# Altium footprint library PCBlib.PcbLib: 9 footprints
Each footprint in its own frame and in the unit in brackets; x right, y up, seen from the top. Pads: shape width x height; smd on the part's side, far side on the other; paste and mask are expansions set on the pad; w line width, h text height; cw(c..) or ccw(c..) is an arc to the next point about the centre after c.
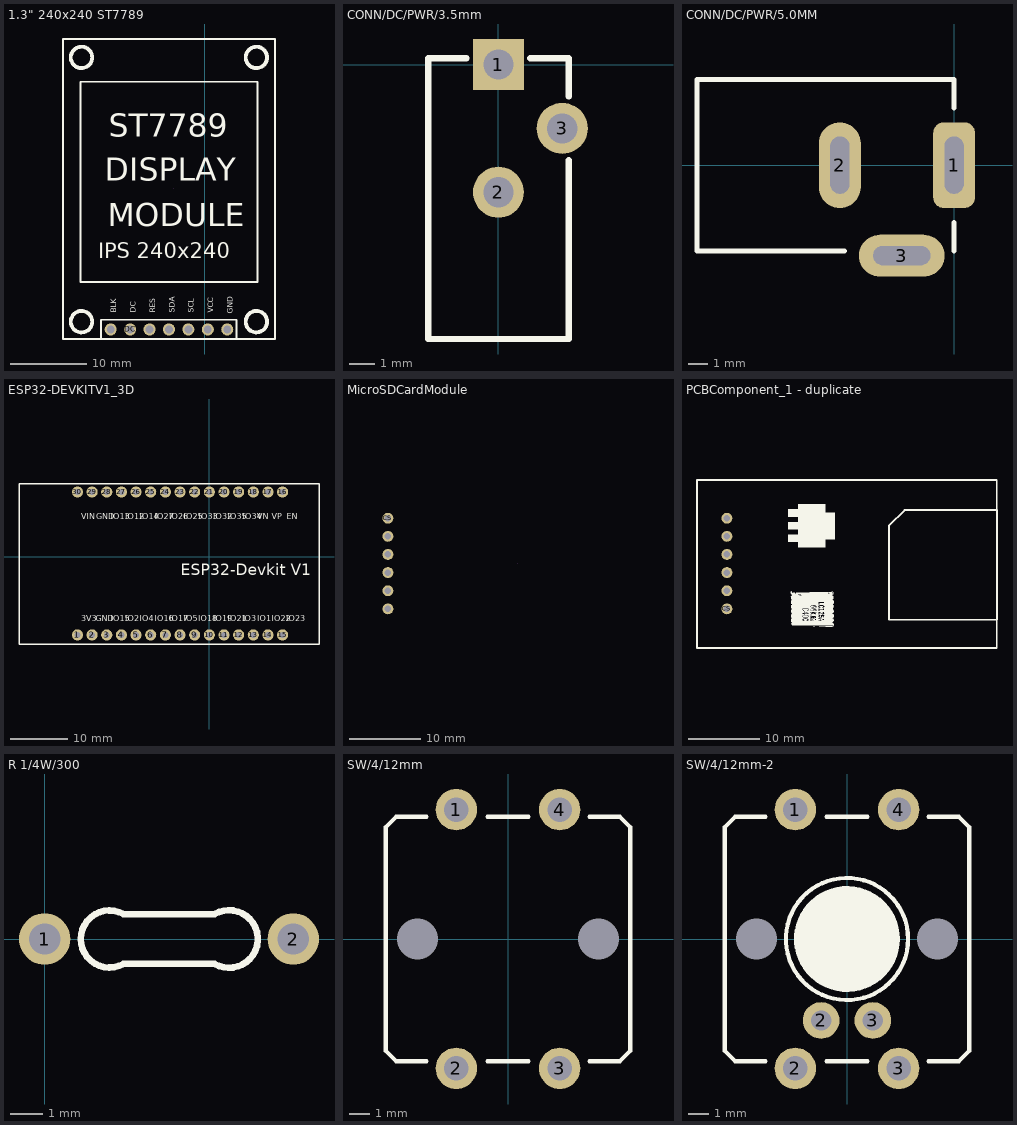
[diagram p0: the footprints below, top view; thin cyan lines are the x and y axes]

## 1.3" 240x240 ST7789 [mm]
pads (7):
  round 1.575 hole 1.02: BLK(-12.319,5.184) DC(-9.779,5.184) GND(2.921,5.184) RES(-7.239,5.184) SCL(-2.159,5.184) SDA(-4.699,5.184) VCC(0.381,5.184)
Top Overlay:
  circle w0.5: c-16.129,6.2 r1.4
  circle w0.5: c6.731,6.2 r1.4
  circle w0.5: c6.731,40.744 r1.4
  circle w0.5: c-16.129,40.744 r1.4
  lines w0.254: -18.542,3.937 9.158,3.937 9.158,43.157 -18.542,43.157 -18.542,3.937 ; -16.256,11.407 6.858,11.407 6.858,37.569 -16.256,37.569 -16.256,11.407 ; -13.589,3.96 4.115,3.96 4.115,6.454 -13.589,6.454 -13.589,3.96
  text "ST7789" at -12.573,30.354 h3
  text "BLK" at -11.588,7.343 h0.7
  text "DC" at -9.048,7.343 h0.7
  text "RES" at -6.508,7.343 h0.7
  text "SDA" at -3.968,7.343 h0.7
  text "SCL" at -1.428,7.343 h0.7
  text "VCC" at 1.112,7.343 h0.7
  text "IPS 240x240" at -13.97,14.471 h2
  text "DISPLAY" at -13.081,24.639 h3
  text "MODULE" at -12.7,18.67 h3
  text "GND" at 3.652,7.216 h0.7
Mechanical 15:
  lines w0.003: -4.121,23.674 -4.12,23.674
3D body "1.3 TFT IPS - Module.stp": height 3.06, standoff -1, extent -18.796,4.191 9.144,43.561

## CONN/DC/PWR/3.5mm [mil]
pads (3):
  rect 80x80 hole 47.24: 1(0,0)
  round 80 hole 47.24: 2(0,-200) 3(100,-100)
Top Overlay:
  lines w10: -50,10 -110,10 -110,-430 110,-430 110,-150 ; 50,10 110,10 110,-50

## CONN/DC/PWR/5.0MM [mm]
pads (3):
  rrect50% 2.2x4.5 hole 1 slot 3 at 90 deg: 1(0,0)
  oval 2.2x4.5 hole 1 slot 3 at 90 deg: 2(-6,0)
  oval 4.5x2.2 hole 1 slot 3 at 0 deg: 3(-2.75,-4.75)
Top Overlay:
  lines w0.254: -5.75,-4.5 -13.5,-4.5 -13.5,4.5 0,4.5 0,3 ; 0,-4.5 0,-3
3D body "SW3dPS-dc range - dc connector[4840.2201].STEP": height 11.02, standoff -3.48, extent -13.576,-5.003 0.25,4.503

## ESP32-DEVKITV1_3D [mm]
pads (30):
  round 1.93 hole 1: 1(-22.87,-13.54) 2(-20.33,-13.54) 3(-17.79,-13.54) 4(-15.25,-13.54) 5(-12.71,-13.54) 6(-10.17,-13.54) 7(-7.63,-13.54) 8(-5.09,-13.54) 9(-2.55,-13.54) 10(-0.01,-13.54) 11(2.53,-13.54) 12(5.07,-13.54) 13(7.61,-13.54) 14(10.15,-13.54) 15(12.69,-13.54) 16(12.69,11.23) 17(10.15,11.23) 18(7.61,11.23) 19(5.07,11.23) 20(2.53,11.23) 21(-0.01,11.23) 22(-2.55,11.23) 23(-5.09,11.23) 24(-7.63,11.23) 25(-10.17,11.23) 26(-12.71,11.23) 27(-15.25,11.23) 28(-17.79,11.23) 29(-20.33,11.23) 30(-22.87,11.23)
Top Overlay:
  lines w0.254: -33,-15.2 19,-15.2 19,12.7 -33,12.7 -33,-15.2
  text "3V3" at -22.21,-11.2 h1.02
  text "GND" at -19.67,-11.2 h1.02
  text "IO15" at -17.13,-11.2 h1.02
  text "IO2" at -14.59,-11.2 h1.02
  text "IO4" at -12.05,-11.2 h1.02
  text "IO16" at -9.51,-11.2 h1.02
  text "IO17" at -6.97,-11.2 h1.02
  text "IO5" at -4.43,-11.2 h1.02
  text "IO18" at -1.89,-11.2 h1.02
  text "IO19" at 0.65,-11.2 h1.02
  text "IO21" at 3.19,-11.2 h1.02
  text "IO3" at 5.73,-11.2 h1.02
  text "IO1" at 8.27,-11.2 h1.02
  text "IO22" at 10.81,-11.2 h1.02
  text "IO23" at 13.35,-11.2 h1.02
  text "VIN" at -22.19,6.52 h1.02
  text "GND" at -19.65,6.52 h1.02
  text "IO13" at -17.11,6.52 h1.02
  text "IO12" at -14.57,6.52 h1.02
  text "IO14" at -12.03,6.52 h1.02
  text "IO27" at -9.49,6.52 h1.02
  text "IO26" at -6.95,6.52 h1.02
  text "IO25" at -4.41,6.52 h1.02
  text "IO33" at -1.87,6.52 h1.02
  text "IO32" at 0.67,6.52 h1.02
  text "IO35" at 3.21,6.52 h1.02
  text "IO34" at 5.75,6.52 h1.02
  text "VN" at 8.29,6.52 h1.02
  text "VP" at 10.83,6.52 h1.02
  text "EN" at 13.37,6.52 h1.02
  text "ESP32-Devkit V1" at -4.93,-3.18 h1.93
Mechanical 13:
  text "ESP32-DEVKITV1" at 5,-17.24 h1.27
3D body "ESP-32_v1.STEP": height 12.75, standoff 0.35, extent -33,-15.139 17.93,13.361
3D body: height 0.25, standoff -12.12, extent 5.588,0.635 5.588,0.635

## MicroSDCardModule [mil]
pads (6):
  round 60 hole 36: CS(-1900,3599.99) GND(-1900,3100) MISO(-1900,3300) MOSI(-1900,3400) SCK(-1900,3500) VCC(-1900,3200)
Mechanical 15:
  lines w0.1: -1187.51,3352.39 -1187.49,3352.41
Multi-Layer:
  drawing of 46 lines, arcs and shapes, not listed
3D body: height 10, standoff 0, extent 320,135 320,135
3D body: height 10, standoff -477, extent -615,4585 -615,4585
3D body "Product_TF Micro SD Card Memory Modul Arduino.STEP": height 122.05, standoff -329.15, extent -2067.83,2875.12 -422.17,3820

## PCBComponent_1 - duplicate [mil]
pads (6):
  round 60 hole 36: CS(1900,1320.2) GND(1900,1820.19) MISO(1900,1620.2) MOSI(1900,1520.2) SCK(1900,1420.2) VCC(1900,1720.2)
Top Overlay:
  drawing of 46 lines, arcs and shapes, not listed
3D body "Product_TF Micro SD Card Memory Modul Arduino.STEP": height 122.05, standoff -329.15, extent 1742.16,1090.12 3387.84,2035

## R 1/4W/300 [mil] "Through hole resitor, axial 300mils, 1/4W"
pads (2):
  round 62 hole 38: 1(0,0) 2(300,0)
Top Overlay:
  lines w8: 95,-30 cw(c78.05,0) 95,30 205,30 cw(c222.5,0) 205,-30 95,-30
3D body "User Library-R-Axial-0_25W-7_62.step": height 97.42, standoff -146.85, extent -11.8,-47.37 311.82,47.38

## SW/4/12mm [mil]
pads (6):
  round 80 hole 47.24: 1(-100,250) 2(-100,-250) 3(100,-250) 4(100,250)
  round 0 hole 78.74: HOLE(-175,0) HOLE(175,0)
Top Overlay:
  lines w8: -157.48,-236.22 -216.54,-236.22 -236.22,-216.54 -236.22,216.54 -216.54,236.22 -157.48,236.22 ; -39.37,-236.22 39.37,-236.22 ; -39.37,236.22 39.37,236.22 ; 157.48,-236.22 216.54,-236.22 236.22,-216.54 236.22,216.54 216.54,236.22 157.48,236.22
3D body "User Library-Tact Switch 12x12x7 -SWT9-1.step": height 287.4, standoff -137.8, extent -236.22,-256.81 236.22,255

## SW/4/12mm-2 [mm]
pads (8):
  round 2.032 hole 1.2: 1(-2.54,6.35) 2(-2.54,-6.35) 3(2.54,-6.35) 4(2.54,6.35)
  round 1.8 hole 1: 2(-1.27,-4) 3(1.27,-4)
  round 0 hole 2: HOLE(-4.445,0) HOLE(4.445,0)
Top Overlay:
  circle w0.203: c0,0 r3
  circle w0.203: c0,0 r2.5
  region: -2.5,0 -2.5,0.246 -2.404,0.729 -2.215,1.184 -1.942,1.594 -1.594,1.942 -1.184,2.215 -0.729,2.404 -0.246,2.5 0,2.5 0.246,2.5 0.729,2.404 1.184,2.215 1.594,1.942 1.942,1.594 2.215,1.184 2.404,0.729 2.5,0.246 2.5,0 2.5,-0.246 2.404,-0.729 2.215,-1.184 1.942,-1.594 1.594,-1.942 1.184,-2.215 0.729,-2.404 0.246,-2.5 0,-2.5 -0.246,-2.5 -0.729,-2.404 -1.184,-2.215 -1.594,-1.942 -1.942,-1.594 -2.215,-1.184 -2.404,-0.729 -2.5,-0.246
  lines w0.203: -4,-6 -5.5,-6 -6,-5.5 -6,5.5 -5.5,6 -4,6 ; -1,-6 1,-6 ; -1,6 1,6 ; 4,-6 5.5,-6 6,-5.5 6,5.5 5.5,6 4,6
3D body "User Library-Tact Switch 12x12x7 -SWT9-1.step": height 7.3, standoff -3.5, extent -6,-6.523 6,6.477